# Altium footprint library tsl_Pcblib.PcbLib: 219 footprints (part 11 of 14)
Each footprint in its own frame and in the unit in brackets; x right, y up, seen from the top. Pads: shape width x height; smd on the part's side, far side on the other; paste and mask are expansions set on the pad; w line width, h text height; cw(c..) or ccw(c..) is an arc to the next point about the centre after c.
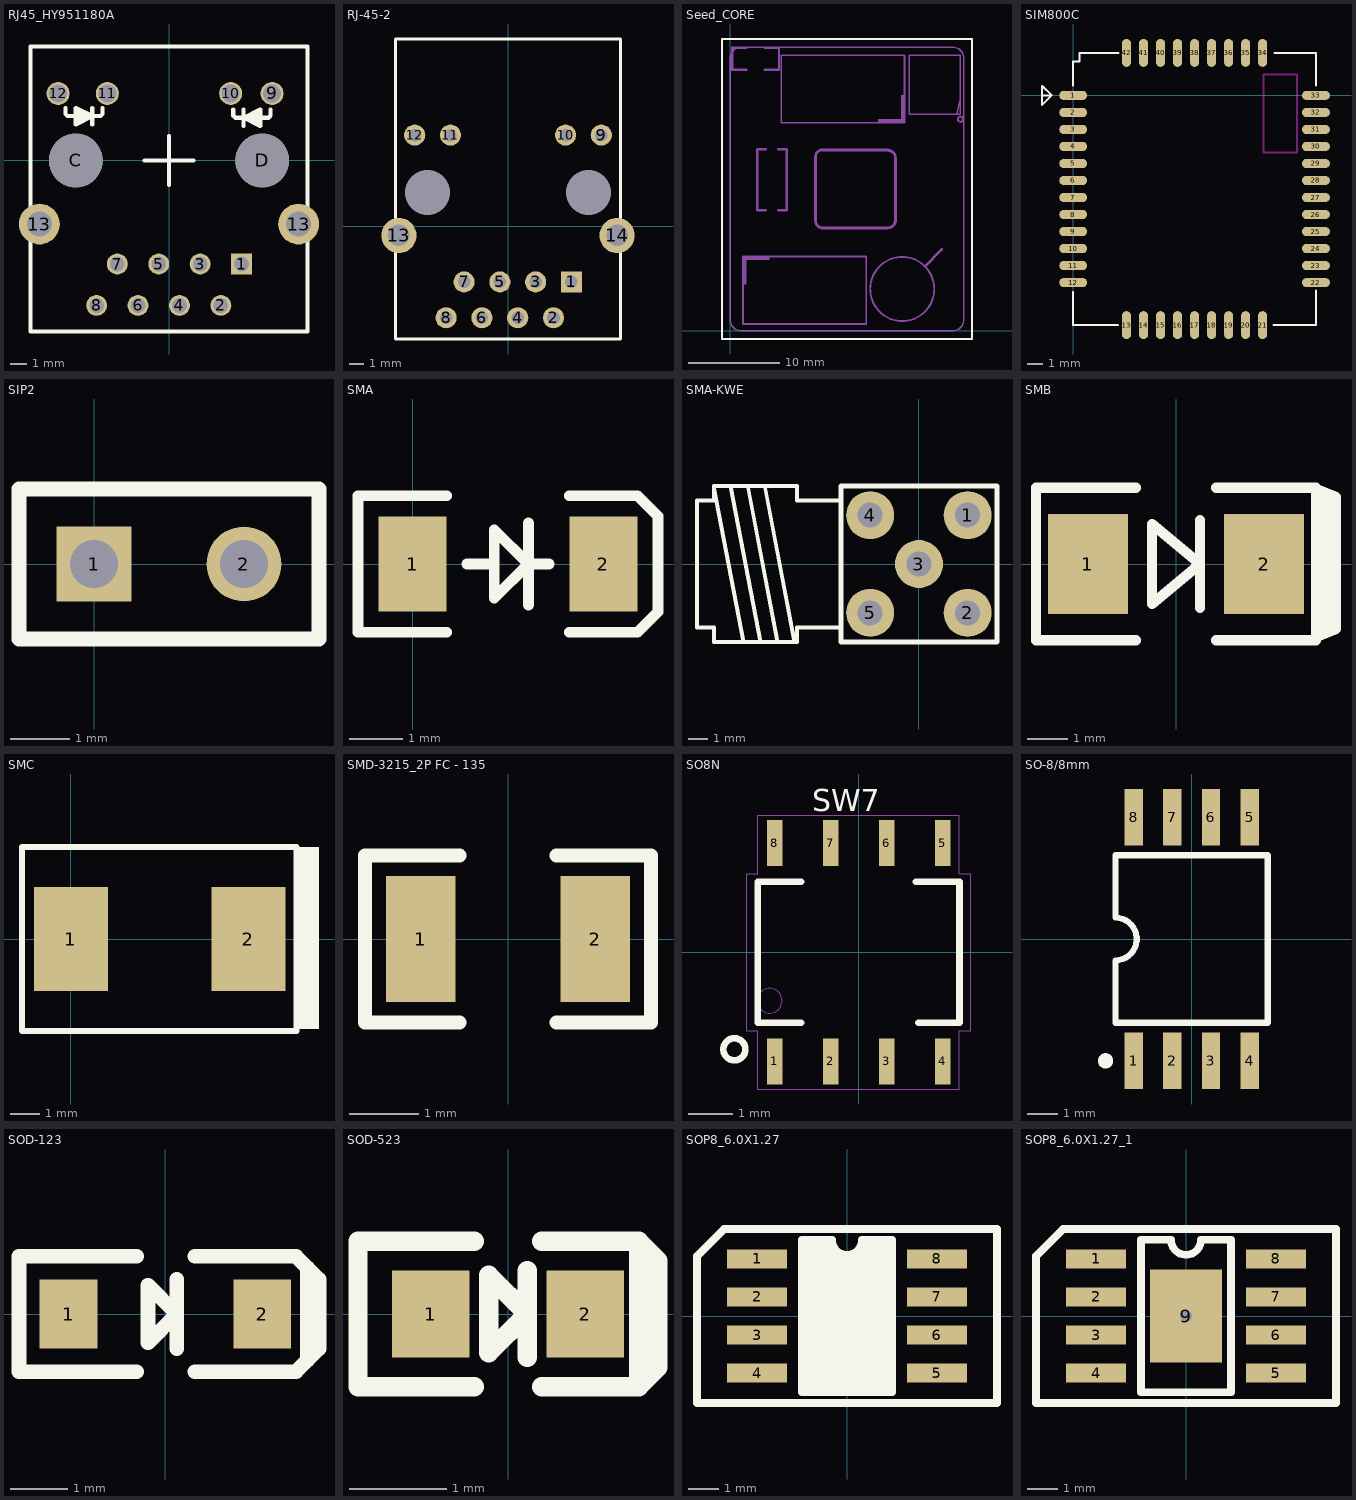
[diagram p10: the footprints below, top view; thin cyan lines are the x and y axes]

## RJ45_HY951180A [mm]
pads (16):
  rect 1.28x1.27 hole 0.9: 1(4.45,-6.35)
  oval 1.28x1.27 hole 0.9: 2(3.18,-8.89) 3(1.91,-6.35) 4(0.64,-8.89) 5(-0.63,-6.35) 6(-1.9,-8.89) 7(-3.17,-6.35) 8(-4.44,-8.89)
  oval 1.41x1.4 / inner oval 1.41x1.4 / far side oval 1.71x1.7 hole 1.1: 9(6.325,4.11) 10(3.785,4.11) 11(-3.785,4.11) 12(-6.8,4.11)
  round 2.5 hole 1.524: 13(-7.95,-3.9) 13(7.95,-3.9)
  round 3.3 hole 3.3 unplated: C(-5.715,0) D(5.715,0)
Top Overlay:
  lines w0.254: -6.358,3.228 -6.358,2.847 -6.231,2.72 -5.723,2.72 ; -5.596,2.339 -5.596,3.101 ; -5.469,2.466 -5.469,2.974 ; -5.342,2.466 -5.342,2.974 ; -5.215,2.593 -5.215,2.847 ; -5.088,2.593 -5.088,2.847 ; -5.088,2.72 -4.707,2.72 ; -4.707,2.212 -4.707,3.228 ; -4.072,3.228 -4.072,2.847 -4.199,2.72 -4.707,2.72 ; -1.5,0 1.5,0 ; 0,-1.5 0,1.5 ; 3.942,3.128 3.942,2.747 4.069,2.62 4.577,2.62 ; 4.577,2.112 4.577,3.128 ; 4.958,2.493 4.958,2.747 ; 4.958,2.62 4.577,2.62 ; 5.085,2.493 5.085,2.747 ; 5.212,2.366 5.212,2.874 ; 5.339,2.366 5.339,2.874 ; 5.466,2.239 5.466,3.001 ; 5.593,2.62 6.101,2.62 6.228,2.747 6.228,3.128 ; -4.707,2.72 -5.723,2.212 -5.723,3.228 -4.707,2.72 ; 4.577,2.62 5.593,2.112 5.593,3.128 4.577,2.62 ; -8.5,-10.5 8.5,-10.5 8.5,7 -8.5,7 -8.5,-10.5

## RJ-45-2 [mm] "HR911103A"
pads (16):
  rect 1.5x1.5 hole 0.889: 1(4.5,-3.945)
  round 1.5 hole 0.889: 2(3.23,-6.485) 3(1.96,-3.945) 4(0.69,-6.485) 5(-0.58,-3.945) 6(-1.85,-6.485) 7(-3.12,-3.945) 8(-4.39,-6.485) 9(6.625,6.485) 10(4.085,6.485) 11(-4.085,6.485) 12(-6.625,6.485)
  round 2.5 hole 1.524: 13(-7.745,-0.645) 14(7.745,-0.645)
  round 3.11 hole 3.2 unplated: ""(-5.715,2.405) ""(5.715,2.405)
Top Overlay:
  lines w0.203: 8,1.055 8,13.255 ; 8,13.255 8,13.305 7.885,13.305 -8,13.305 -8,-7.995 8,-7.995 8,13.255

## Seed_CORE [mm]
Top Overlay:
  lines w0.203: -0.889,-0.889 26.416,-0.889 26.416,31.877 -0.889,31.877 -0.889,29.337 -0.889,-0.889
Mechanical 2:
  circle w0.203: c25.146,23.114 r0.284
  circle w0.203: c18.796,4.572 r3.5
  region: 19.05,23.114 16.129,23.114 16.129,22.733 19.05,22.733
  region: 19.05,22.733 19.05,25.781 18.669,25.781 18.669,22.733
  rectangle: 1.397,7.747 4.318,8.128
  region: 1.397,8.128 1.397,5.08 1.778,5.08 1.778,8.128
  lines w0.152: 24.765,23.665 25.146,25.273 ; 0,1.27 ccw(c1.27,1.27) 1.27,0 24.257,0 ccw(c24.257,1.27) 25.527,1.27 25.527,29.718 ccw(c24.257,29.718) 24.257,30.988 1.27,30.988 ccw(c1.27,29.718) 0,29.718 0,1.27 ; 19.558,23.665 19.558,30.099 25.146,30.099 25.146,23.665 19.558,23.665
  lines w0.203: 1.413,0.762 14.859,0.762 14.859,8.128 1.413,8.128 1.413,0.762 ; 5.588,22.733 5.588,30.099 19.034,30.099 19.034,22.733 5.588,22.733
  lines w0.25: 1.794,28.518 0.244,28.518 0.244,30.918 1.794,30.918 ; 3.794,28.518 5.344,28.518 5.344,30.918 3.794,30.918
  lines w0.254: 3.872,13.185 2.972,13.185 2.972,19.835 3.872,19.835 ; 5.272,13.185 6.172,13.185 6.172,19.835 5.272,19.835
  lines w0.3: 9.905,19.752 17.252,19.752 ; 9.975,11.24 17.183,11.24 ccw(c17.183,12.11) 18.053,12.11 ; 10.054,19.752 ccw(c10.054,19.032) 9.334,19.032 9.334,12.03 ccw(c10.124,12.03) 10.124,11.24 ; 17.252,19.705 cw(c17.252,18.905) 18.053,18.905 18.053,11.983 ; 21.271,7.047 23.107,8.883
3D body "Seed_CORE_V1.1.step": height 9.17, standoff 2, extent 0,0 25.527,30.988

## SIM800C [mm]
pads (42):
  oval 1.8x0.6 smd: 1(0,0) 2(0,-1.1) 3(0,-2.2) 4(0,-3.3) 5(0,-4.4) 6(0,-5.5) 7(0,-6.6) 8(0,-7.7) 9(0,-8.8) 10(0,-9.9) 11(0,-11) 12(0,-12.1) 22(15.7,-12.1) 23(15.7,-11) 24(15.7,-9.9) 25(15.7,-8.8) 26(15.7,-7.7) 27(15.7,-6.6) 28(15.7,-5.5) 29(15.7,-4.4) 30(15.7,-3.3) 31(15.7,-2.2) 32(15.7,-1.1) 33(15.7,0)
  oval 0.6x1.8 smd: 13(3.45,-14.85) 14(4.55,-14.85) 15(5.65,-14.85) 16(6.75,-14.85) 17(7.85,-14.85) 18(8.95,-14.85) 19(10.05,-14.85) 20(11.15,-14.85) 21(12.25,-14.85) 34(12.25,2.75) 35(11.15,2.75) 36(10.05,2.75) 37(8.95,2.75) 38(7.85,2.75) 39(6.75,2.75) 40(5.65,2.75) 41(4.55,2.75) 42(3.45,2.75)
Top Overlay:
  lines w0.127: -2.007,0 -1.397,0 ; 0,-12.7 0,-14.834 2.896,-14.834 ; 0,0.635 0,2.21 0.406,2.21 0.406,2.743 2.921,2.743 ; 12.954,-14.859 15.697,-14.859 15.697,-12.624 ; 13.03,2.743 15.697,2.743 15.697,0.635 ; -1.397,0 -2.007,0.61 -2.007,-0.61 -1.397,0
Keep-Out Layer:
  lines w0.127: 12.319,-3.683 14.478,-3.683 14.478,1.346 12.319,1.346 12.319,-3.683
3D body "User Library-SIM800C-1.STEP": height 2.47, standoff 0.13, extent 0.127,-14.896 15.827,2.704

## SIP2 [mil]
pads (2):
  rect 50x50 hole 32: 1(0,0)
  round 50 hole 32: 2(100,0)
Top Overlay:
  lines w10: -50,-50 150,-50 150,50 -50,50 -50,-50
3D body "1001-2.STEP": height 336.22, standoff -118.11, extent -49.99,-49.99 150.01,50.01

## SMA [mil]
pads (2):
  rect 50x70 smd: 1(0,0) 2(140,0)
Top Overlay:
  lines w7.87: 25,-50 -40,-50 -40,50 25,50 ; 40,0 60,0 ; 85,-30 85,30 ; 100,0 85,0 ; 115,-50 165,-50 180,-35 180,35 165,50 115,50 ; 85,0 60,25 60,-25 85,0
3D body "DO-214AC.STEP": height 94.49, standoff 0, extent -20.31,-53.15 160.79,53.15

## SMA-KWE [mm]
pads (5):
  round 2.5 hole 1.3: 1(2.54,2.54) 2(2.54,-2.54) 3(0,0) 4(-2.54,2.54) 5(-2.54,-2.54)
Top Overlay:
  lines w0.203: -10.668,3.937 -9.144,-4.064 ; -9.779,3.937 -8.255,-4.064 ; -8.89,3.937 -7.366,-4.064 ; -8.001,3.937 -6.477,-4.064 ; -4.064,-3.302 -6.35,-3.302 -6.35,-4.064 -10.668,-4.064 -10.668,-3.302 -11.557,-3.302 -11.557,3.302 -10.668,3.302 -10.668,4.064 -6.35,4.064 -6.35,3.302 -4.064,3.302
  lines w0.254: 4.064,2.032 4.064,4.064 -4.064,4.064 -4.064,-4.064 4.064,-4.064 4.064,2.54
3D body "User Library-142-0701-301.step": height 10.24, standoff -3.26, extent -11.815,-3.708 3.82,4.216

## SMB [mm]
pads (2):
  rect 2x2.5 smd: 1(-2.2,0) 2(2.2,0)
Top Overlay:
  lines w0.254: -1,-1.905 -3.5,-1.905 -3.5,1.905 -1,1.905 ; 0.6,-1.1 0.6,1.1 ; 1,-1.905 3.5,-1.905 ; 1,1.905 3.5,1.905 ; -0.6,-1 -0.6,1 0.6,0 -0.6,-1 ; 3.5,-1.826 3.5,1.877 4,1.677 4,-1.626 3.5,-1.826
  lines w0.3: 3.75,-1.627 3.75,1.373
  lines w0.5: 3.75,1.143 3.75,1.584
3D body "DO-214AA.STEP": height 2.5, standoff 0, extent -2.8,-1.95 2.8,1.95

## SMC [mm]
pads (2):
  rect 2.5x3.5 smd: 1(0,0) 2(6,0)
Top Overlay:
  rectangle: 7.62,-3.048 8.382,3.111
  lines w0.203: -1.651,-3.111 6.604,-3.111 7.62,-3.111 7.62,3.111 6.604,3.111 -1.651,3.111 -1.651,-3.048
3D body "DO-214AB.STEP": height 2.7, standoff 0, extent -1.012,-3.227 7.108,2.973

## SMD-3215_2P FC - 135 [mm]
pads (2):
  rect 1x1.8 smd: 1(-1.25,0) 2(1.25,0)
Top Overlay:
  lines w0.2: -0.695,-1.2 -2.05,-1.2 -2.05,1.2 -0.695,1.2 ; 0.695,-1.2 2.05,-1.2 2.05,1.2 0.695,1.2

## SO8N [mm]
pads (8):
  rect 0.35x1.05 smd paste-0.05 mask+0.05: 1(-1.905,-2.475) 2(-0.635,-2.475) 3(0.635,-2.475) 4(1.905,-2.475) 5(1.905,2.475) 6(0.635,2.475) 7(-0.635,2.475) 8(-1.905,2.475)
Top Overlay:
  circle w0.15: c-2.816,-2.2 r0.25
  lines w0.15: -1.3,-1.6 -2.286,-1.6 -2.286,1.6 -1.3,1.6 ; 1.3,1.6 2.286,1.6 2.286,-1.6 1.35,-1.6
  text "SW7" at -1.05,3.2 h0.5
Mechanical 1:
  circle w0.025: c-2.016,-1.1 r0.283
  lines w0.025: -2.54,-1.778 -2.286,-1.778 -2.286,-3.1 2.286,-3.1 2.286,-1.778 2.54,-1.778 2.54,1.778 2.286,1.778 2.286,3.1 -2.286,3.1 -2.286,1.778 -2.54,1.778 -2.54,-1.778

## SO-8/8mm [mm]
pads (8):
  rect 0.6x1.85 smd: 1(-1.905,-4) 2(-0.635,-4) 3(0.635,-4) 4(1.905,-4) 5(1.905,4) 6(0.635,4) 7(-0.635,4) 8(-1.905,4)
Top Overlay:
  circle w0.25: c-2.825,-4 r0.125
  lines w0.2: 2.5,-2.75 -2.5,-2.75 -2.5,-0.7 ccw(c-2.5,0) -2.5,0.7 -2.5,2.75 2.5,2.75 2.5,-2.7

## SOD-123 [mm]
pads (2):
  rect 1x1.2 smd: 1(-1.68,0) 2(1.68,0)
Top Overlay:
  lines w0.254: -0.5,-1 -2.54,-1 -2.54,1 -0.5,1 ; 0.2,-0.6 0.2,0.6 ; 0.508,-1 2.267,-1 2.667,-0.6 2.667,0.6 2.267,1 0.508,1 ; 2.467,-0.8 2.467,0.8 ; -0.3,-0.5 0.2,0 -0.3,0.5 -0.3,-0.5
3D body "SOD-123.STEP": height 1.2, standoff 0, extent -1.85,-0.8 1.85,0.8

## SOD-523 [mm]
pads (2):
  rect 0.8x0.9 smd: 1(-0.8,0) 2(0.8,0)
Top Overlay:
  lines w0.2: -0.35,-0.75 -1.55,-0.75 -1.55,0.75 -0.35,0.75 ; 0.2,-0.45 0.2,0.45 ; 0.35,-0.75 1.35,-0.75 ; 0.35,0.75 1.35,0.75 ; 1.5,-0.5 1.5,0.5 ; 1.35,-0.75 1.35,0.75 ; 1.35,-0.75 1.55,-0.55 1.55,0.55 1.35,0.75 ; -0.2,-0.4 -0.2,0.4 0.2,0 -0.2,-0.4
3D body "SOD-523.STEP": height 0.65, standoff 0, extent -0.8,-0.4 0.8,0.4

## SOP8_6.0X1.27 [mm]
pads (8):
  rect 2x0.635 smd: 1(-3,1.905) 2(-3,0.635) 3(-3,-0.635) 4(-3,-1.905) 5(3,-1.905) 6(3,-0.635) 7(3,0.635) 8(3,1.905)
Top Overlay:
  region: -1.6,2.6 -1.6,-2.6 1.6,-2.6 1.6,2.6 0.51,2.6 0.471,2.405 0.36,2.24 0.195,2.129 0,2.09 -0.195,2.129 -0.36,2.24 -0.471,2.405 -0.51,2.6 -0.5,2.6
  lines w0.254: -5,-2.9 -5,2 -4.1,2.9 5,2.9 5,-2.9 -5,-2.9 ; -1.5,-2.54 -1.5,2.54 -0.5,2.54 ccw(c0,2.54) 0.5,2.54 1.5,2.54 1.5,-2.54 -1.5,-2.54
3D body "SO-8.STEP": height 1.7, standoff 0, extent -3,-2.45 3,2.45

## SOP8_6.0X1.27_1 [mm]
pads (9):
  rect 2x0.635 smd: 1(-3,1.905) 2(-3,0.635) 3(-3,-0.635) 4(-3,-1.905) 5(3,-1.905) 6(3,-0.635) 7(3,0.635) 8(3,1.905)
  rect 2.4x3.1 / inner oval 1.2x1.21 / far side oval 1.2x1.21 hole 0.4: 9(0,0)
Top Overlay:
  lines w0.254: -5,-2.9 5,-2.9 5,2.9 -4.1,2.9 -5,2 -5,-2.9 ; -1.5,-2.54 1.5,-2.54 1.5,2.54 0.5,2.54 cw(c0,2.54) -0.5,2.54 -1.5,2.54 -1.5,-2.54
3D body "SO-8.STEP": height 1.7, standoff 0, extent -3,-2.45 3,2.45